# Altium footprint library SMD_Bauteile.PcbLib: 355 footprints (part 9 of 23)
Each footprint in its own frame and in the unit in brackets; x right, y up, seen from the top. Pads: shape width x height; smd on the part's side, far side on the other; paste and mask are expansions set on the pad; w line width, h text height; cw(c..) or ccw(c..) is an arc to the next point about the centre after c.
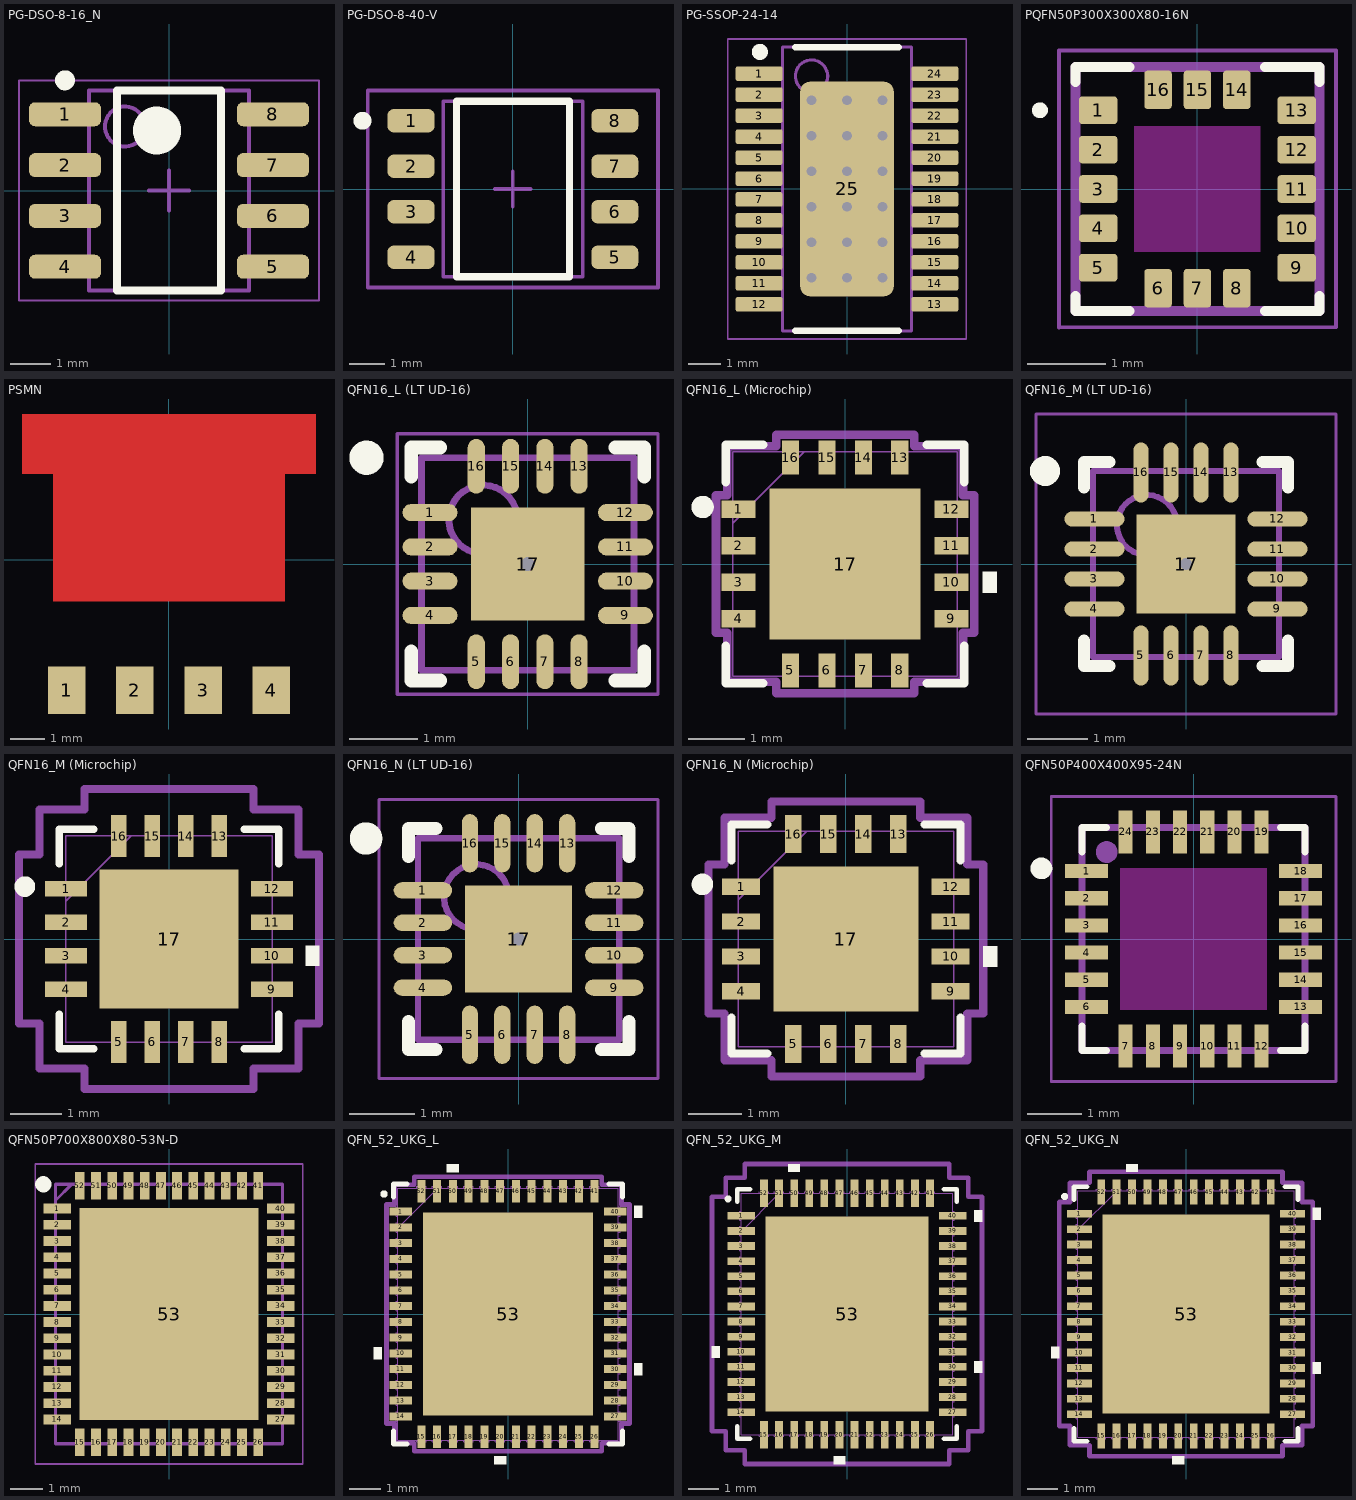
[diagram p8: the footprints below, top view; thin cyan lines are the x and y axes]

## PG-DSO-8-16_N [mm] "SOP, 8-Leads, Body 4.9x3.9mm, Pitch 1.27mm, IPC Medium Density"
height 1.75
pads (8):
  rrect50% 1.8x0.6 smd: 1(-2.6,1.905) 2(-2.6,0.635) 3(-2.6,-0.635) 4(-2.6,-1.905) 5(2.6,-1.905) 6(2.6,-0.635) 7(2.6,0.635) 8(2.6,1.905)
Top Overlay:
  circle w0.6: c-0.3,1.5 r0.3
  circle w0.25: c-2.6,2.755 r0.125
  lines w0.2: -1.3,-2.5 1.3,-2.5 1.3,2.5 -1.3,2.5 -1.3,-2.5
Top Component Center:
  lines w0.1: -0.5,0 0.5,0 ; 0,-0.5 0,0.5
Top Component Outline:
  circle w0.1: c-1.1,1.6 r0.5
  lines w0.1: -2,-2.5 2,-2.5 2,2.5 -2,2.5 -2,-2.5
Top Courtyard (Mech26):
  lines w0.05: -3.75,-2.75 3.75,-2.75 3.75,2.75 -3.75,2.75 -3.75,-2.75
3D body: height 1.75, standoff 0.11, extent -2,-2.5 2,2.5

## PG-DSO-8-40-V [mm] "SOIC,1.27mm pitch;8 pin,3.90mm W X 4.90mm L X 1.75mm H body"
height 1.75
pads (8):
  rrect50% 1.31x0.65 smd paste+0: 1(-2.845,1.905) 2(-2.845,0.635) 3(-2.845,-0.635) 4(-2.845,-1.905) 5(2.845,-1.905) 6(2.845,-0.635) 7(2.845,0.635) 8(2.845,1.905)
Top Overlay:
  circle w0.25: c-4.2,1.905 r0.125
  lines w0.2: -1.575,-2.45 1.575,-2.45 1.575,2.45 -1.575,2.45 -1.575,-2.45
Top Component Center:
  lines w0.1: -0.5,0 0.5,0 ; 0,-0.5 0,0.5
Top Component Outline:
  lines w0.1: -1.95,-2.45 1.95,-2.45 1.95,2.45 -1.95,2.45 -1.95,-2.45
Top Courtyard (Mech26):
  lines w0.1: -4.05,-2.75 4.05,-2.75 4.05,2.75 -4.05,2.75 -4.05,-2.75
3D body "DSO-8-16.stp": height 1.76, standoff 0, extent -3,-2.5 3,2.5

## PG-SSOP-24-14 [mm] "SOP, 24-Leads, Body 8,65x3,90mm, Pitch 0,65mm, Thermal Pad 6,65x2,90mm, IPC Medium Density"
height 1.7
pads (25):
  rrect25% 1.45x0.45 smd mask+0.02: 1(-2.725,3.575) 2(-2.725,2.925) 3(-2.725,2.275) 4(-2.725,1.625) 5(-2.725,0.975) 6(-2.725,0.325) 7(-2.725,-0.325) 8(-2.725,-0.975) 9(-2.725,-1.625) 10(-2.725,-2.275) 11(-2.725,-2.925) 12(-2.725,-3.575) 13(2.725,-3.575) 14(2.725,-2.925) 15(2.725,-2.275) 16(2.725,-1.625) 17(2.725,-0.975) 18(2.725,-0.325) 19(2.725,0.325) 20(2.725,0.975) 21(2.725,1.625) 22(2.725,2.275) 23(2.725,2.925) 24(2.725,3.575)
  rrect20% 2.9x6.65 smd: 25(0,0)
via 1.1,-2.75 diameter 0.7 hole 0.3
via 0,-2.75 diameter 0.7 hole 0.3
via -1.1,-2.75 diameter 0.7 hole 0.3
via 1.1,-1.65 diameter 0.7 hole 0.3
via 0,-1.65 diameter 0.7 hole 0.3
via -1.1,-1.65 diameter 0.7 hole 0.3
via 1.1,-0.55 diameter 0.7 hole 0.3
via 0,-0.55 diameter 0.7 hole 0.3
via -1.1,-0.55 diameter 0.7 hole 0.3
via 0,0.55 diameter 0.7 hole 0.3
via -1.1,0.55 diameter 0.7 hole 0.3
via 1.1,1.65 diameter 0.7 hole 0.3
via 0,1.65 diameter 0.7 hole 0.3
via -1.1,1.65 diameter 0.7 hole 0.3
via 1.1,2.75 diameter 0.7 hole 0.3
via 0,2.75 diameter 0.7 hole 0.3
via -1.1,2.75 diameter 0.7 hole 0.3
via 1.1,0.55 diameter 0.7 hole 0.3
Top Overlay:
  circle w0.25: c-2.7,4.25 r0.125
  lines w0.2: -1.6,-4.4 1.6,-4.4 ; -1.6,4.4 1.6,4.4
Top Component Center:
  lines w0.1: -0.5,0 0.5,0 ; 0,-0.5 0,0.5
Top Component Outline:
  circle w0.1: c-1.1,3.5 r0.5
  lines w0.1: -2,-4.4 -2,4.4 2,4.4 2,-4.4 -2,-4.4
Top Courtyard (Mech26):
  lines w0.05: -3.7,-4.65 3.7,-4.65 3.7,4.65 -3.7,4.65 -3.7,-4.65
3D body: height 1.7, standoff 0, extent -2,-4.4 2,4.4

## PQFN50P300X300X80-16N [mm]
pads (16):
  rrect25% 0.49x0.35 smd: 1(-1.26,1) 2(-1.26,0.5) 3(-1.26,0) 4(-1.26,-0.5) 5(-1.26,-1) 9(1.26,-1) 10(1.26,-0.5) 11(1.26,0) 12(1.26,0.5) 13(1.26,1)
  rrect25% 0.35x0.49 smd: 6(-0.5,-1.26) 7(0,-1.26) 8(0.5,-1.26) 14(0.5,1.26) 15(0,1.26) 16(-0.5,1.26)
Top Overlay:
  circle w0.1: c-2,1 r0.05
  lines w0.127: -1.55,-1.36 -1.55,-1.55 -0.86,-1.55 ; -1.55,1.36 -1.55,1.55 -0.86,1.55 ; 0.86,-1.55 1.55,-1.55 1.55,-1.36 ; 0.86,1.55 1.55,1.55 1.55,1.36
Keep-Out Layer:
  region: 0.8,-0.8 -0.8,-0.8 -0.8,0.8 0.8,0.8
  region: 0.8,-0.8 -0.8,-0.8 -0.8,0.8 0.8,0.8
Mech Misc 1:
  circle w0.1: c-1.25,1 r0.05
  lines w0.127: -1.55,-1.55 -1.55,1.55 1.55,1.55 1.55,-1.55 -1.55,-1.55
Mech 15:
  lines w0.05: -1.76,-1.76 -1.76,1.76 1.76,1.76 1.76,-1.75 -1.76,-1.76
3D body "step_temp.STEP": height 0.78, standoff -0.02, extent -1.5,-1.5 1.5,1.5

## PSMN [mm]
pads (5):
  rect 1.1x1.4 smd: 1(-3,-3.825) 2(-1,-3.825) 3(1,-3.825) 4(3,-3.825)
  round 0.025 smd paste+0: 5(0,1.525)
Top Layer:
  region: -4.3,2.515 -3.4,2.515 -3.4,-1.225 3.4,-1.225 3.4,2.515 4.3,2.515 4.3,4.275 -4.3,4.275

## QFN16_L (LT UD-16) [mm] "QFN, 16-Leads, Body 3.1x3.1mm, Pitch 0.5mm, Thermal Pad 1.65x1.65mm, IPC High Density"
height 0.8
pads (17):
  oval 0.8x0.25 smd: 1(-1.425,0.75) 2(-1.425,0.25) 3(-1.425,-0.25) 4(-1.425,-0.75) 9(1.425,-0.75) 10(1.425,-0.25) 11(1.425,0.25) 12(1.425,0.75)
  oval 0.25x0.8 smd: 5(-0.75,-1.425) 6(-0.25,-1.425) 7(0.25,-1.425) 8(0.75,-1.425) 13(0.75,1.425) 14(0.25,1.425) 15(-0.25,1.425) 16(-0.75,1.425)
  rect 1.65x1.65 smd: 17(0,0)
via 0,0 diameter 0.5 hole 0.2
Top Overlay:
  circle w0.25: c-2.35,1.55 r0.125
  lines w0.2: -1.7,-1.275 -1.7,-1.7 -1.275,-1.7 ; -1.7,1.275 -1.7,1.7 -1.275,1.7 ; 1.275,-1.7 1.7,-1.7 1.7,-1.275 ; 1.275,1.7 1.7,1.7 1.7,1.275
Mech Misc 1:
  circle w0.1: c-0.65,0.65 r0.5
  lines w0.1: -1.55,-1.55 1.55,-1.55 1.55,1.55 -1.55,1.55 -1.55,-1.55
Mech 15:
  lines w0.05: -1.9,-1.9 1.9,-1.9 1.9,1.9 -1.9,1.9 -1.9,-1.9
  lines w0.1: -0.5,0 0.5,0 ; 0,-0.5 0,0.5
3D body: height 0.8, standoff 0, extent -1.55,-1.55 1.55,1.55

## QFN16_L (Microchip) [mm]
pads (17):
  rect 0.606x0.306 smd paste+0 mask+0: 1(-1.897,0.975) 2(-1.897,0.325) 3(-1.897,-0.325) 4(-1.897,-0.975) 9(1.897,-0.975) 10(1.897,-0.325) 11(1.897,0.325) 12(1.897,0.975)
  rect 0.306x0.606 smd paste+0 mask+0: 5(-0.975,-1.897) 6(-0.325,-1.897) 7(0.325,-1.897) 8(0.975,-1.897) 13(0.975,1.897) 14(0.325,1.897) 15(-0.325,1.897) 16(-0.975,1.897)
  rect 2.692x2.692 smd paste-1.333 mask+0: 17(0,0)
Top Overlay:
  circle w0.2: c-2.54,1.016 r0.1
  region: 2.454,-0.135 2.708,-0.135 2.708,-0.516 2.454,-0.516
  lines w0.152: -2.127,-1.461 -2.127,-2.127 -1.461,-2.127 ; -2.127,1.461 -2.127,2.127 -1.461,2.127 ; 1.461,-2.127 2.127,-2.127 2.127,-1.461 ; 1.461,2.127 2.127,2.127 2.127,1.461
Top Paste:
  region: 1.246,-0.1 0.1,-0.1 0.1,-1.246 1.246,-1.246
  region: 1.246,1.246 0.1,1.246 0.1,0.1 1.246,0.1
  region: -0.1,-0.1 -1.246,-0.1 -1.246,-1.246 -0.1,-1.246
  region: -0.1,1.246 -1.246,1.246 -1.246,0.1 -0.1,0.1
Mech Misc 1:
  lines w0.025: -2,0.73 -0.73,2 ; -2,-2 -2,2 2,2 2,-2 -2,-2 ; -2,-1.153 -2,-0.797 -2,-1.153 ; -2,-0.503 -2,-0.147 -2,-0.503 ; -2,0.147 -2,0.503 -2,0.147 ; -2,0.797 -2,1.153 -2,0.797 ; -1.153,-2 -0.797,-2 -1.153,-2 ; -1.153,2 -0.797,2 -1.153,2 ; -0.503,-2 -0.147,-2 -0.503,-2 ; -0.503,2 -0.147,2 -0.503,2 ; 0.147,-2 0.503,-2 0.147,-2 ; 0.147,2 0.503,2 0.147,2 ; 0.797,-2 1.153,-2 0.797,-2 ; 0.797,2 1.153,2 0.797,2 ; 2,-1.153 2,-0.797 2,-1.153 ; 2,-0.503 2,-0.147 2,-0.503 ; 2,0.147 2,0.503 2,0.147 ; 2,0.797 2,1.153 2,0.797
Mech 15:
  lines w0.152: -2.302,-1.229 -2.302,1.229 -2.102,1.229 -2.102,2.102 -1.229,2.102 -1.229,2.302 1.229,2.302 1.229,2.102 2.102,2.102 2.102,1.229 2.302,1.229 2.302,-1.229 2.102,-1.229 2.102,-2.102 1.229,-2.102 1.229,-2.302 -1.229,-2.302 -1.229,-2.102 -2.102,-2.102 -2.102,-1.229 -2.302,-1.229
3D body "QFN16_4x4MC_MCH.step": height 1, standoff 0, extent -2,-2 2,2

## QFN16_M (LT UD-16) [mm] "QFN, 16-Leads, Body 3.1x3.1mm, Pitch 0.5mm, Thermal Pad 1.65x1.65mm, IPC Low Density"
height 0.8
pads (17):
  oval 1x0.25 smd: 1(-1.525,0.75) 2(-1.525,0.25) 3(-1.525,-0.25) 4(-1.525,-0.75) 9(1.525,-0.75) 10(1.525,-0.25) 11(1.525,0.25) 12(1.525,0.75)
  oval 0.25x1 smd: 5(-0.75,-1.525) 6(-0.25,-1.525) 7(0.25,-1.525) 8(0.75,-1.525) 13(0.75,1.525) 14(0.25,1.525) 15(-0.25,1.525) 16(-0.75,1.525)
  rect 1.65x1.65 smd: 17(0,0)
via 0,0 diameter 0.5 hole 0.2
Top Overlay:
  circle w0.25: c-2.35,1.55 r0.125
  lines w0.2: -1.7,-1.275 -1.7,-1.7 -1.275,-1.7 ; -1.7,1.275 -1.7,1.7 -1.275,1.7 ; 1.275,-1.7 1.7,-1.7 1.7,-1.275 ; 1.275,1.7 1.7,1.7 1.7,1.275
Mech Misc 1:
  circle w0.1: c-0.65,0.65 r0.5
  lines w0.1: -1.55,-1.55 1.55,-1.55 1.55,1.55 -1.55,1.55 -1.55,-1.55
Mech 15:
  lines w0.05: -2.5,-2.5 2.5,-2.5 2.5,2.5 -2.5,2.5 -2.5,-2.5
  lines w0.1: -0.5,0 0.5,0 ; 0,-0.5 0,0.5
3D body: height 0.8, standoff 0, extent -1.55,-1.55 1.55,1.55

## QFN16_M (Microchip) [mm]
pads (17):
  rect 0.806x0.306 smd paste+0 mask+0: 1(-1.997,0.975) 2(-1.997,0.325) 3(-1.997,-0.325) 4(-1.997,-0.975) 9(1.997,-0.975) 10(1.997,-0.325) 11(1.997,0.325) 12(1.997,0.975)
  rect 0.306x0.806 smd paste+0 mask+0: 5(-0.975,-1.997) 6(-0.325,-1.997) 7(0.325,-1.997) 8(0.975,-1.997) 13(0.975,1.997) 14(0.325,1.997) 15(-0.325,1.997) 16(-0.975,1.997)
  rect 2.692x2.692 smd paste-1.333 mask+0: 17(0,0)
Top Overlay:
  circle w0.2: c-2.794,1.016 r0.1
  region: 2.654,-0.135 2.908,-0.135 2.908,-0.516 2.654,-0.516
  lines w0.152: -2.127,-1.461 -2.127,-2.127 -1.461,-2.127 ; -2.127,1.461 -2.127,2.127 -1.461,2.127 ; 1.461,-2.127 2.127,-2.127 2.127,-1.461 ; 1.461,2.127 2.127,2.127 2.127,1.461
Top Paste:
  region: -0.1,1.246 -1.246,1.246 -1.246,0.1 -0.1,0.1
  region: -0.1,-0.1 -1.246,-0.1 -1.246,-1.246 -0.1,-1.246
  region: 1.246,1.246 0.1,1.246 0.1,0.1 1.246,0.1
  region: 1.246,-0.1 0.1,-0.1 0.1,-1.246 1.246,-1.246
Mech Misc 1:
  lines w0.025: -2,0.73 -0.73,2 ; -2,-2 2,-2 2,2 -2,2 -2,-2 ; -2,-1.153 -2,-0.797 -2,-1.153 ; -2,-0.503 -2,-0.147 -2,-0.503 ; -2,0.147 -2,0.503 -2,0.147 ; -2,0.797 -2,1.153 -2,0.797 ; -1.153,-2 -0.797,-2 -1.153,-2 ; -1.153,2 -0.797,2 -1.153,2 ; -0.503,-2 -0.147,-2 -0.503,-2 ; -0.503,2 -0.147,2 -0.503,2 ; 0.147,-2 0.503,-2 0.147,-2 ; 0.147,2 0.503,2 0.147,2 ; 0.797,-2 1.153,-2 0.797,-2 ; 0.797,2 1.153,2 0.797,2 ; 2,-1.153 2,-0.797 2,-1.153 ; 2,-0.503 2,-0.147 2,-0.503 ; 2,0.147 2,0.503 2,0.147 ; 2,0.797 2,1.153 2,0.797
Mech 15:
  lines w0.152: -2.908,-1.636 -2.908,1.636 -2.508,1.636 -2.508,2.508 -1.636,2.508 -1.636,2.908 1.636,2.908 1.636,2.508 2.508,2.508 2.508,1.636 2.908,1.636 2.908,-1.636 2.508,-1.636 2.508,-2.508 1.636,-2.508 1.636,-2.908 -1.636,-2.908 -1.636,-2.508 -2.508,-2.508 -2.508,-1.636 -2.908,-1.636
3D body "QFN16_4x4MC_MCH.step": height 1, standoff 0, extent -2,-2 2,2

## QFN16_N (LT UD-16) [mm] "QFN, 16-Leads, Body 3.1x3.1mm, Pitch 0.5mm, Thermal Pad 1.65x1.65mm, IPC Medium Density"
height 0.8
pads (17):
  oval 0.9x0.25 smd: 1(-1.475,0.75) 2(-1.475,0.25) 3(-1.475,-0.25) 4(-1.475,-0.75) 9(1.475,-0.75) 10(1.475,-0.25) 11(1.475,0.25) 12(1.475,0.75)
  oval 0.25x0.9 smd: 5(-0.75,-1.475) 6(-0.25,-1.475) 7(0.25,-1.475) 8(0.75,-1.475) 13(0.75,1.475) 14(0.25,1.475) 15(-0.25,1.475) 16(-0.75,1.475)
  rect 1.65x1.65 smd: 17(0,0)
via 0,0 diameter 0.5 hole 0.2
Top Overlay:
  circle w0.25: c-2.35,1.55 r0.125
  lines w0.2: -1.7,-1.275 -1.7,-1.7 -1.275,-1.7 ; -1.7,1.275 -1.7,1.7 -1.275,1.7 ; 1.275,-1.7 1.7,-1.7 1.7,-1.275 ; 1.275,1.7 1.7,1.7 1.7,1.275
Mech Misc 1:
  circle w0.1: c-0.65,0.65 r0.5
  lines w0.1: -1.55,-1.55 -1.55,1.55 1.55,1.55 1.55,-1.55 -1.55,-1.55
Mech 15:
  lines w0.05: -2.15,-2.15 -2.15,2.15 2.15,2.15 2.15,-2.15 -2.15,-2.15
  lines w0.1: -0.5,0 0.5,0 ; 0,-0.5 0,0.5
3D body: height 0.8, standoff 0, extent -1.55,-1.55 1.55,1.55

## QFN16_N (Microchip) [mm]
pads (17):
  rect 0.706x0.306 smd paste+0 mask+0: 1(-1.947,0.975) 2(-1.947,0.325) 3(-1.947,-0.325) 4(-1.947,-0.975) 9(1.947,-0.975) 10(1.947,-0.325) 11(1.947,0.325) 12(1.947,0.975)
  rect 0.306x0.706 smd paste+0 mask+0: 5(-0.975,-1.947) 6(-0.325,-1.947) 7(0.325,-1.947) 8(0.975,-1.947) 13(0.975,1.947) 14(0.325,1.947) 15(-0.325,1.947) 16(-0.975,1.947)
  rect 2.692x2.692 smd paste-1.333 mask+0: 17(0,0)
Top Overlay:
  circle w0.2: c-2.667,1.016 r0.1
  region: 2.554,-0.135 2.808,-0.135 2.808,-0.516 2.554,-0.516
  lines w0.152: -2.127,-1.461 -2.127,-2.127 -1.461,-2.127 ; -2.127,1.461 -2.127,2.127 -1.461,2.127 ; 1.461,-2.127 2.127,-2.127 2.127,-1.461 ; 1.461,2.127 2.127,2.127 2.127,1.461
Top Paste:
  region: -0.1,1.246 -1.246,1.246 -1.246,0.1 -0.1,0.1
  region: -0.1,-0.1 -1.246,-0.1 -1.246,-1.246 -0.1,-1.246
  region: 1.246,1.246 0.1,1.246 0.1,0.1 1.246,0.1
  region: 1.246,-0.1 0.1,-0.1 0.1,-1.246 1.246,-1.246
Mech Misc 1:
  lines w0.025: -2,0.73 -0.73,2 ; -2,-2 2,-2 2,2 -2,2 -2,-2 ; -2,-1.153 -2,-0.797 -2,-1.153 ; -2,-0.503 -2,-0.147 -2,-0.503 ; -2,0.147 -2,0.503 -2,0.147 ; -2,0.797 -2,1.153 -2,0.797 ; -1.153,-2 -0.797,-2 -1.153,-2 ; -1.153,2 -0.797,2 -1.153,2 ; -0.503,-2 -0.147,-2 -0.503,-2 ; -0.503,2 -0.147,2 -0.503,2 ; 0.147,-2 0.503,-2 0.147,-2 ; 0.147,2 0.503,2 0.147,2 ; 0.797,-2 1.153,-2 0.797,-2 ; 0.797,2 1.153,2 0.797,2 ; 2,-1.153 2,-0.797 2,-1.153 ; 2,-0.503 2,-0.147 2,-0.503 ; 2,0.147 2,0.503 2,0.147 ; 2,0.797 2,1.153 2,0.797
Mech 15:
  lines w0.152: -2.554,-1.382 -2.254,-1.382 -2.254,-2.254 -1.382,-2.254 -1.382,-2.554 1.382,-2.554 1.382,-2.254 2.254,-2.254 2.254,-1.382 2.554,-1.382 2.554,1.382 2.254,1.382 2.254,2.254 1.382,2.254 1.382,2.554 -1.382,2.554 -1.382,2.254 -2.254,2.254 -2.254,1.382 -2.554,1.382 -2.554,-1.382
3D body "QFN16_4x4MC_MCH.step": height 1, standoff 0, extent -2,-2 2,2

## QFN50P400X400X95-24N [mm]
pads (24):
  rect 0.79x0.26 smd: 1(-1.97,1.25) 2(-1.97,0.75) 3(-1.97,0.25) 4(-1.97,-0.25) 5(-1.97,-0.75) 6(-1.97,-1.25) 13(1.97,-1.25) 14(1.97,-0.75) 15(1.97,-0.25) 16(1.97,0.25) 17(1.97,0.75) 18(1.97,1.25)
  rect 0.26x0.79 smd: 7(-1.25,-1.97) 8(-0.75,-1.97) 9(-0.25,-1.97) 10(0.25,-1.97) 11(0.75,-1.97) 12(1.25,-1.97) 19(1.25,1.97) 20(0.75,1.97) 21(0.25,1.97) 22(-0.25,1.97) 23(-0.75,1.97) 24(-1.25,1.97)
Top Overlay:
  circle w0.2: c-2.8,1.3 r0.1
  lines w0.127: -2.05,-1.6 -2.05,-2.05 -1.6,-2.05 ; -2.05,1.6 -2.05,2.05 -1.6,2.05 ; 1.6,-2.05 2.05,-2.05 2.05,-1.6 ; 1.6,2.05 2.05,2.05 2.05,1.6
Keep-Out Layer:
  region: 1.35,-1.3 -1.35,-1.3 -1.35,1.3 1.35,1.3
  region: 1.35,-1.3 -1.35,-1.3 -1.35,1.3 1.35,1.3
Mech Misc 1:
  circle w0.2: c-1.6,1.6 r0.1
  lines w0.127: -2.05,-2.05 2.05,-2.05 2.05,2.05 -2.05,2.05 -2.05,-2.05
Mech 15:
  lines w0.05: -2.62,-2.62 2.62,-2.62 2.62,2.62 -2.62,2.62 -2.62,-2.62

## QFN50P700X800X80-53N-D [mm]
pads (53):
  rect 0.85x0.3 smd: 1(-3.45,3.25) 2(-3.45,2.75) 3(-3.45,2.25) 4(-3.45,1.75) 5(-3.45,1.25) 6(-3.45,0.75) 7(-3.45,0.25) 8(-3.45,-0.25) 9(-3.45,-0.75) 10(-3.45,-1.25) 11(-3.45,-1.75) 12(-3.45,-2.25) 13(-3.45,-2.75) 14(-3.45,-3.25) 27(3.45,-3.25) 28(3.45,-2.75) 29(3.45,-2.25) 30(3.45,-1.75) 31(3.45,-1.25) 32(3.45,-0.75) 33(3.45,-0.25) 34(3.45,0.25) 35(3.45,0.75) 36(3.45,1.25) 37(3.45,1.75) 38(3.45,2.25) 39(3.45,2.75) 40(3.45,3.25)
  rect 0.3x0.85 smd: 15(-2.75,-3.95) 16(-2.25,-3.95) 17(-1.75,-3.95) 18(-1.25,-3.95) 19(-0.75,-3.95) 20(-0.25,-3.95) 21(0.25,-3.95) 22(0.75,-3.95) 23(1.25,-3.95) 24(1.75,-3.95) 25(2.25,-3.95) 26(2.75,-3.95) 41(2.75,3.95) 42(2.25,3.95) 43(1.75,3.95) 44(1.25,3.95) 45(0.75,3.95) 46(0.25,3.95) 47(-0.25,3.95) 48(-0.75,3.95) 49(-1.25,3.95) 50(-1.75,3.95) 51(-2.25,3.95) 52(-2.75,3.95)
  rect 5.51x6.55 smd: 53(0,0)
Top Overlay:
  circle w0.25: c-3.875,4 r0.125
Mech Misc 1:
  lines w0.1: -3.5,3.5 -3,4 ; -3.5,-4 -3.5,4 3.5,4 3.5,-4 -3.5,-4
Mech 15:
  lines w0.05: -4.125,-4.625 -4.125,4.625 4.125,4.625 4.125,-4.625 -4.125,-4.625
3D body "LTC2325CUKG-16#PBF.stp": height 0.8, standoff 0, extent -3.55,-4.05 3.55,4.05

## QFN_52_UKG_L [mil]
pads (53):
  rect 28x10 smd paste+0 mask+0: 1(-134,127.95) 2(-134,108.27) 3(-134,88.58) 4(-134,68.9) 5(-134,49.21) 6(-134,29.53) 7(-134,9.84) 8(-134,-9.84) 9(-134,-29.53) 10(-134,-49.21) 11(-134,-68.9) 12(-134,-88.58) 13(-134,-108.27) 14(-134,-127.95) 27(134,-127.95) 28(134,-108.27) 29(134,-88.58) 30(134,-68.9) 31(134,-49.21) 32(134,-29.53) 33(134,-9.84) 34(134,9.84) 35(134,29.53) 36(134,49.21) 37(134,68.9) 38(134,88.58) 39(134,108.27) 40(134,127.95)
  rect 10x28 smd paste+0 mask+0: 15(-108.27,-153.5) 16(-88.58,-153.5) 17(-68.9,-153.5) 18(-49.21,-153.5) 19(-29.53,-153.5) 20(-9.84,-153.5) 21(9.84,-153.5) 22(29.53,-153.5) 23(49.21,-153.5) 24(68.9,-153.5) 25(88.58,-153.5) 26(108.27,-153.5) 41(108.27,153.5) 42(88.58,153.5) 43(68.9,153.5) 44(49.21,153.5) 45(29.53,153.5) 46(9.84,153.5) 47(-9.84,153.5) 48(-29.53,153.5) 49(-49.21,153.5) 50(-68.9,153.5) 51(-88.58,153.5) 52(-108.27,153.5)
  rect 213x254 smd paste-126.5 mask+0: 53(0,0)
Top Overlay:
  circle w5: c-155,150 r2
  region: -61.4,177.5 -76.4,177.5 -76.4,187.5 -61.4,187.5
  region: 158,135.45 168,135.45 168,120.45 158,120.45
  region: 158,-61.4 168,-61.4 168,-76.4 158,-76.4
  region: -2.34,-177.5 -17.34,-177.5 -17.34,-187.5 -2.34,-187.5
  region: -158,-41.71 -168,-41.71 -168,-56.71 -158,-56.71
  lines w6: -143,-146.05 -143,-162.5 -126.37,-162.5 ; -143,146.05 -143,162.5 -126.37,162.5 ; 126.37,-162.5 143,-162.5 143,-146.05 ; 126.37,162.5 143,162.5 143,146.05
Top Paste:
  region: 102.56,-80.14 57.19,-80.14 57.19,-123.06 102.56,-123.06
  region: 102.56,-29.34 57.19,-29.34 57.19,-72.26 102.56,-72.26
  region: 102.56,21.46 57.19,21.46 57.19,-21.46 102.56,-21.46
  region: 102.56,72.26 57.19,72.26 57.19,29.34 102.56,29.34
  region: 102.56,123.06 57.19,123.06 57.19,80.14 102.56,80.14
  region: 49.31,-80.14 3.94,-80.14 3.94,-123.06 49.31,-123.06
  region: 49.31,-29.34 3.94,-29.34 3.94,-72.26 49.31,-72.26
  region: 49.31,21.46 3.94,21.46 3.94,-21.46 49.31,-21.46
  region: 49.31,72.26 3.94,72.26 3.94,29.34 49.31,29.34
  region: 49.31,123.06 3.94,123.06 3.94,80.14 49.31,80.14
  region: -3.94,-80.14 -49.31,-80.14 -49.31,-123.06 -3.94,-123.06
  region: -3.94,-29.34 -49.31,-29.34 -49.31,-72.26 -3.94,-72.26
  region: -3.94,21.46 -49.31,21.46 -49.31,-21.46 -3.94,-21.46
  region: -3.94,72.26 -49.31,72.26 -49.31,29.34 -3.94,29.34
  region: -3.94,123.06 -49.31,123.06 -49.31,80.14 -3.94,80.14
  region: -57.19,-80.14 -102.56,-80.14 -102.56,-123.06 -57.19,-123.06
  region: -57.19,-29.34 -102.56,-29.34 -102.56,-72.26 -57.19,-72.26
  region: -57.19,21.46 -102.56,21.46 -102.56,-21.46 -57.19,-21.46
  region: -57.19,72.26 -102.56,72.26 -102.56,29.34 -57.19,29.34
  region: -57.19,123.06 -102.56,123.06 -102.56,80.14 -57.19,80.14
Mech Misc 1:
  drawing of 213 lines, arcs and shapes, not listed
Mech 15:
  lines w6: -152,-136.95 -152,136.95 -142,136.95 -142,161.5 -117.27,161.5 -117.27,171.5 117.27,171.5 117.27,161.5 142,161.5 142,136.95 152,136.95 152,-136.95 142,-136.95 142,-161.5 117.27,-161.5 117.27,-171.5 -117.27,-171.5 -117.27,-161.5 -142,-161.5 -142,-136.95 -152,-136.95
3D body: height 10, standoff 0, extent 0,0 10,10
3D body "UKG_52A_ADI-L.step": height 32.09, standoff 0, extent -140,-159.48 140,159.49

## QFN_52_UKG_M [mil]
pads (53):
  rect 36x10 smd paste+0 mask+0: 1(-138,127.95) 2(-138,108.27) 3(-138,88.58) 4(-138,68.9) 5(-138,49.21) 6(-138,29.53) 7(-138,9.84) 8(-138,-9.84) 9(-138,-29.53) 10(-138,-49.21) 11(-138,-68.9) 12(-138,-88.58) 13(-138,-108.27) 14(-138,-127.95) 27(138,-127.95) 28(138,-108.27) 29(138,-88.58) 30(138,-68.9) 31(138,-49.21) 32(138,-29.53) 33(138,-9.84) 34(138,9.84) 35(138,29.53) 36(138,49.21) 37(138,68.9) 38(138,88.58) 39(138,108.27) 40(138,127.95)
  rect 10x36 smd paste+0 mask+0: 15(-108.27,-157.5) 16(-88.58,-157.5) 17(-68.9,-157.5) 18(-49.21,-157.5) 19(-29.53,-157.5) 20(-9.84,-157.5) 21(9.84,-157.5) 22(29.53,-157.5) 23(49.21,-157.5) 24(68.9,-157.5) 25(88.58,-157.5) 26(108.27,-157.5) 41(108.27,157.5) 42(88.58,157.5) 43(68.9,157.5) 44(49.21,157.5) 45(29.53,157.5) 46(9.84,157.5) 47(-9.84,157.5) 48(-29.53,157.5) 49(-49.21,157.5) 50(-68.9,157.5) 51(-88.58,157.5) 52(-108.27,157.5)
  rect 213x254 smd paste-126.5 mask+0: 53(0,0)
Top Overlay:
  circle w5: c-155,150 r2
  region: -61.4,185.5 -76.4,185.5 -76.4,195.5 -61.4,195.5
  region: 166,135.45 176,135.45 176,120.45 166,120.45
  region: 166,-61.4 176,-61.4 176,-76.4 166,-76.4
  region: -2.34,-185.5 -17.34,-185.5 -17.34,-195.5 -2.34,-195.5
  region: -166,-41.71 -176,-41.71 -176,-56.71 -166,-56.71
  lines w6: -143,-146.05 -143,-162.5 -126.37,-162.5 ; -143,146.05 -143,162.5 -126.37,162.5 ; 126.37,-162.5 143,-162.5 143,-146.05 ; 126.37,162.5 143,162.5 143,146.05
Top Paste:
  region: 102.56,-80.14 57.19,-80.14 57.19,-123.06 102.56,-123.06
  region: 102.56,-29.34 57.19,-29.34 57.19,-72.26 102.56,-72.26
  region: 102.56,21.46 57.19,21.46 57.19,-21.46 102.56,-21.46
  region: 102.56,72.26 57.19,72.26 57.19,29.34 102.56,29.34
  region: 102.56,123.06 57.19,123.06 57.19,80.14 102.56,80.14
  region: 49.31,-80.14 3.94,-80.14 3.94,-123.06 49.31,-123.06
  region: 49.31,-29.34 3.94,-29.34 3.94,-72.26 49.31,-72.26
  region: 49.31,21.46 3.94,21.46 3.94,-21.46 49.31,-21.46
  region: 49.31,72.26 3.94,72.26 3.94,29.34 49.31,29.34
  region: 49.31,123.06 3.94,123.06 3.94,80.14 49.31,80.14
  region: -3.94,-80.14 -49.31,-80.14 -49.31,-123.06 -3.94,-123.06
  region: -3.94,-29.34 -49.31,-29.34 -49.31,-72.26 -3.94,-72.26
  region: -3.94,21.46 -49.31,21.46 -49.31,-21.46 -3.94,-21.46
  region: -3.94,72.26 -49.31,72.26 -49.31,29.34 -3.94,29.34
  region: -3.94,123.06 -49.31,123.06 -49.31,80.14 -3.94,80.14
  region: -57.19,-80.14 -102.56,-80.14 -102.56,-123.06 -57.19,-123.06
  region: -57.19,-29.34 -102.56,-29.34 -102.56,-72.26 -57.19,-72.26
  region: -57.19,21.46 -102.56,21.46 -102.56,-21.46 -57.19,-21.46
  region: -57.19,72.26 -102.56,72.26 -102.56,29.34 -57.19,29.34
  region: -57.19,123.06 -102.56,123.06 -102.56,80.14 -57.19,80.14
Mech Misc 1:
  drawing of 213 lines, arcs and shapes, not listed
Mech 15:
  lines w6: -176,-152.95 -176,152.95 -158,152.95 -158,177.5 -133.27,177.5 -133.27,195.5 133.27,195.5 133.27,177.5 158,177.5 158,152.95 176,152.95 176,-152.95 158,-152.95 158,-177.5 133.27,-177.5 133.27,-195.5 -133.27,-195.5 -133.27,-177.5 -158,-177.5 -158,-152.95 -176,-152.95
3D body: height 10, standoff 0, extent 0,0 10,10
3D body "UKG_52A_ADI-M.step": height 32.09, standoff 0, extent -140,-159.49 140,159.49

## QFN_52_UKG_N [mil]
pads (53):
  rect 32x10 smd paste+0 mask+0: 1(-136,127.95) 2(-136,108.27) 3(-136,88.58) 4(-136,68.9) 5(-136,49.21) 6(-136,29.53) 7(-136,9.84) 8(-136,-9.84) 9(-136,-29.53) 10(-136,-49.21) 11(-136,-68.9) 12(-136,-88.58) 13(-136,-108.27) 14(-136,-127.95) 27(136,-127.95) 28(136,-108.27) 29(136,-88.58) 30(136,-68.9) 31(136,-49.21) 32(136,-29.53) 33(136,-9.84) 34(136,9.84) 35(136,29.53) 36(136,49.21) 37(136,68.9) 38(136,88.58) 39(136,108.27) 40(136,127.95)
  rect 10x32 smd paste+0 mask+0: 15(-108.27,-155.5) 16(-88.58,-155.5) 17(-68.9,-155.5) 18(-49.21,-155.5) 19(-29.53,-155.5) 20(-9.84,-155.5) 21(9.84,-155.5) 22(29.53,-155.5) 23(49.21,-155.5) 24(68.9,-155.5) 25(88.58,-155.5) 26(108.27,-155.5) 41(108.27,155.5) 42(88.58,155.5) 43(68.9,155.5) 44(49.21,155.5) 45(29.53,155.5) 46(9.84,155.5) 47(-9.84,155.5) 48(-29.53,155.5) 49(-49.21,155.5) 50(-68.9,155.5) 51(-88.58,155.5) 52(-108.27,155.5)
  rect 213x254 smd paste-126.5 mask+0: 53(0,0)
Top Overlay:
  circle w5: c-155,150 r2
  region: -61.4,181.5 -76.4,181.5 -76.4,191.5 -61.4,191.5
  region: 162,135.45 172,135.45 172,120.45 162,120.45
  region: 162,-61.4 172,-61.4 172,-76.4 162,-76.4
  region: -2.34,-181.5 -17.34,-181.5 -17.34,-191.5 -2.34,-191.5
  region: -162,-41.71 -172,-41.71 -172,-56.71 -162,-56.71
  lines w6: -143,-146.05 -143,-162.5 -126.37,-162.5 ; -143,146.05 -143,162.5 -126.37,162.5 ; 126.37,-162.5 143,-162.5 143,-146.05 ; 126.37,162.5 143,162.5 143,146.05
Top Paste:
  region: 102.56,-80.14 57.19,-80.14 57.19,-123.06 102.56,-123.06
  region: 102.56,-29.34 57.19,-29.34 57.19,-72.26 102.56,-72.26
  region: 102.56,21.46 57.19,21.46 57.19,-21.46 102.56,-21.46
  region: 102.56,72.26 57.19,72.26 57.19,29.34 102.56,29.34
  region: 102.56,123.06 57.19,123.06 57.19,80.14 102.56,80.14
  region: 49.31,-80.14 3.94,-80.14 3.94,-123.06 49.31,-123.06
  region: 49.31,-29.34 3.94,-29.34 3.94,-72.26 49.31,-72.26
  region: 49.31,21.46 3.94,21.46 3.94,-21.46 49.31,-21.46
  region: 49.31,72.26 3.94,72.26 3.94,29.34 49.31,29.34
  region: 49.31,123.06 3.94,123.06 3.94,80.14 49.31,80.14
  region: -3.94,-80.14 -49.31,-80.14 -49.31,-123.06 -3.94,-123.06
  region: -3.94,-29.34 -49.31,-29.34 -49.31,-72.26 -3.94,-72.26
  region: -3.94,21.46 -49.31,21.46 -49.31,-21.46 -3.94,-21.46
  region: -3.94,72.26 -49.31,72.26 -49.31,29.34 -3.94,29.34
  region: -3.94,123.06 -49.31,123.06 -49.31,80.14 -3.94,80.14
  region: -57.19,-80.14 -102.56,-80.14 -102.56,-123.06 -57.19,-123.06
  region: -57.19,-29.34 -102.56,-29.34 -102.56,-72.26 -57.19,-72.26
  region: -57.19,21.46 -102.56,21.46 -102.56,-21.46 -57.19,-21.46
  region: -57.19,72.26 -102.56,72.26 -102.56,29.34 -57.19,29.34
  region: -57.19,123.06 -102.56,123.06 -102.56,80.14 -57.19,80.14
Mech Misc 1:
  drawing of 213 lines, arcs and shapes, not listed
Mech 15:
  lines w6: -162,-142.95 -162,142.95 -148,142.95 -148,167.5 -123.27,167.5 -123.27,181.5 123.27,181.5 123.27,167.5 148,167.5 148,142.95 162,142.95 162,-142.95 148,-142.95 148,-167.5 123.27,-167.5 123.27,-181.5 -123.27,-181.5 -123.27,-167.5 -148,-167.5 -148,-142.95 -162,-142.95
3D body: height 10, standoff 0, extent 0,0 10,10
3D body "UKG_52A_ADI.step": height 32.09, standoff 0, extent -140,-159.48 140,159.49